# Altium footprint library 3M THD.PcbLib: 163 footprints (part 11 of 14) (continued)
## 3M_N3627-6202RB [mm] "3M, 3000 Series, 24 Contacts - Pitch 2.54mm - Straight Four-Wall Header (Black) With Short Roll Pin Latch/Ejectors" (continued)
Mechanical 14:
  circle w0.1: c-22.924,-0.254 r1.27
  circle w0.1: c22.924,-0.254 r1.27
  lines w0.1: -24.892,-3.175 -21.564,-3.175 ; -23.924,-0.254 -22.924,-0.254 ; -22.924,-1.254 -22.924,-0.254 ; -22.924,0.746 -22.924,-0.254 ; -21.924,-0.254 -22.924,-0.254 ; -21.564,-4.318 -21.564,-1.727 -14.605,-1.727 -14.605,1.27 -21.564,1.27 -21.564,4.318 ; -20.722,-4.318 -20.722,-1.727 ; -20.722,1.27 -20.722,4.318 ; -18.289,-4.318 -18.288,-1.727 ; -17.907,-1.727 -17.907,-3.175 17.907,-3.175 17.907,-1.727 ; -17.907,1.27 -17.907,3.175 17.907,3.175 17.907,1.27 ; -11.119,-4.318 -11.119,-3.175 ; -9.201,-4.318 -9.201,-3.175 ; 17.446,-4.318 17.446,-3.175 ; 17.446,3.175 17.446,4.318 ; 18.288,1.27 18.288,4.318 ; 18.329,-4.318 18.329,-1.727 ; 20.722,-4.318 20.722,-1.727 ; 20.722,1.27 20.722,4.318 ; 21.564,-4.318 21.564,-1.727 14.605,-1.727 14.605,1.27 21.564,1.27 21.564,4.318 ; 21.564,-3.175 24.892,-3.175 ; 21.564,3.175 24.892,3.175 ; 21.924,-0.254 22.924,-0.254 ; 22.924,-1.254 22.924,-0.254 ; 22.924,0.746 22.924,-0.254 ; 23.924,-0.254 22.924,-0.254 ; -24.892,-4.318 24.892,-4.318 24.892,4.318 -24.892,4.318 -24.892,-4.318 ; -24.892,3.175 -21.564,3.175 -24.892,3.175 ; -24.448,-1.134 -24.448,0.626 -22.924,1.506 -21.4,0.626 -21.4,-1.134 -22.924,-2.014 -24.448,-1.134 ; -18.288,1.27 -18.288,4.318 -18.288,1.27 ; -17.446,-4.318 -17.446,-3.175 -17.446,-4.318 ; -17.446,3.175 -17.446,4.318 -17.446,3.175 ; -15.24,-3.175 -13.97,-4.318 -12.7,-3.175 -15.24,-3.175 ; 21.4,-1.134 21.4,0.626 22.924,1.506 24.448,0.626 24.448,-1.134 22.924,-2.014 21.4,-1.134
  text "24" at 15.205,1.727 h1.02
  text "1" at -16.307,-2.921 h1.02
3D body "3M_N3627-6202RB.stp": height 18.69, standoff -2.84, extent -33.821,-4.318 33.821,4.318

## 3M_N3627-6202RB_a [mm] "3M, 3000 Series, 24 Contacts - Pitch 2.54mm - Straight Four-Wall Header (Black) With Short Roll Pin Latch/Ejectors"
height 24.6
pads (26):
  round 1.6 hole 0.9: 1(-13.97,-1.27) 2(-13.97,1.27) 3(-11.43,-1.27) 4(-11.43,1.27) 5(-8.89,-1.27) 6(-8.89,1.27) 7(-6.35,-1.27) 8(-6.35,1.27) 9(-3.81,-1.27) 10(-3.81,1.27) 11(-1.27,-1.27) 12(-1.27,1.27) 13(1.27,-1.27) 14(1.27,1.27) 15(3.81,-1.27) 16(3.81,1.27) 17(6.35,-1.27) 18(6.35,1.27) 19(8.89,-1.27) 20(8.89,1.27) 21(11.43,-1.27) 22(11.43,1.27) 23(13.97,-1.27) 24(13.97,1.27)
  round 4.6 hole 2.8: MTG1(-22.924,-0.254) MTG2(22.924,-0.254)
Top Overlay:
  lines w0.2: -24.892,-2 -24.892,-4.318 ; -24.892,1.7 -24.892,4.3 ; -2.032,-4.318 -2.032,-3.175 ; 2.032,-4.318 2.032,-3.175 ; 14.732,-4.318 -24.892,-4.318 ; 14.732,4.318 -24.892,4.318 24.892,4.318 ; 24.892,-2 24.892,-4.318 -24.892,-4.318 ; 24.892,1.7 24.892,4.3 ; -17.907,-3.175 17.907,-3.175 17.907,3.175 -17.907,3.175 -17.907,-3.175 ; -15.24,-3.175 -12.7,-3.175 -13.97,-4.318 -15.24,-3.175
  text "1" at -16.307,-2.921 h1.02
  text "24" at 15.205,1.727 h1.02
Mechanical 8:
  lines w0.1: -14.97,-1.27 -13.97,-1.27 ; -14.97,1.27 -13.97,1.27 ; -13.97,-2.27 -13.97,-1.27 ; -13.97,-0.27 -13.97,-1.27 ; -13.97,0.27 -13.97,1.27 ; -13.97,2.27 -13.97,1.27 ; -12.97,-1.27 -13.97,-1.27 ; -12.97,1.27 -13.97,1.27 ; -12.43,-1.27 -11.43,-1.27 ; -12.43,1.27 -11.43,1.27 ; -11.43,-2.27 -11.43,-1.27 ; -11.43,-0.27 -11.43,-1.27 ; -11.43,0.27 -11.43,1.27 ; -11.43,2.27 -11.43,1.27 ; -10.43,-1.27 -11.43,-1.27 ; -10.43,1.27 -11.43,1.27 ; -9.89,-1.27 -8.89,-1.27 ; -9.89,1.27 -8.89,1.27 ; -8.89,-2.27 -8.89,-1.27 ; -8.89,-0.27 -8.89,-1.27 ; -8.89,0.27 -8.89,1.27 ; -8.89,2.27 -8.89,1.27 ; -7.89,-1.27 -8.89,-1.27 ; -7.89,1.27 -8.89,1.27 ; -7.35,-1.27 -6.35,-1.27 ; -7.35,1.27 -6.35,1.27 ; -6.35,-2.27 -6.35,-1.27 ; -6.35,-0.27 -6.35,-1.27 ; -6.35,0.27 -6.35,1.27 ; -6.35,2.27 -6.35,1.27 ; -5.35,-1.27 -6.35,-1.27 ; -5.35,1.27 -6.35,1.27 ; -4.81,-1.27 -3.81,-1.27 ; -4.81,1.27 -3.81,1.27 ; -3.81,-2.27 -3.81,-1.27 ; -3.81,-0.27 -3.81,-1.27 ; -3.81,0.27 -3.81,1.27 ; -3.81,2.27 -3.81,1.27 ; -2.81,-1.27 -3.81,-1.27 ; -2.81,1.27 -3.81,1.27 ; -2.27,-1.27 -1.27,-1.27 ; -2.27,1.27 -1.27,1.27 ; -1.27,-2.27 -1.27,-1.27 ; -1.27,-0.27 -1.27,-1.27 ; -1.27,0.27 -1.27,1.27 ; -1.27,2.27 -1.27,1.27 ; -1,0 0,0 ; -0.27,-1.27 -1.27,-1.27 ; -0.27,1.27 -1.27,1.27 ; 0,-1 0,0 ; 0,1 0,0 ; 0.27,-1.27 1.27,-1.27 ; 0.27,1.27 1.27,1.27 ; 1,0 0,0 ; 1.27,-2.27 1.27,-1.27 ; 1.27,-0.27 1.27,-1.27 ; 1.27,0.27 1.27,1.27 ; 1.27,2.27 1.27,1.27 ; 2.27,-1.27 1.27,-1.27 ; 2.27,1.27 1.27,1.27 ; 2.81,-1.27 3.81,-1.27 ; 2.81,1.27 3.81,1.27 ; 3.81,-2.27 3.81,-1.27 ; 3.81,-0.27 3.81,-1.27 ; 3.81,0.27 3.81,1.27 ; 3.81,2.27 3.81,1.27 ; 4.81,-1.27 3.81,-1.27 ; 4.81,1.27 3.81,1.27 ; 5.35,-1.27 6.35,-1.27 ; 5.35,1.27 6.35,1.27 ; 6.35,-2.27 6.35,-1.27 ; 6.35,-0.27 6.35,-1.27 ; 6.35,0.27 6.35,1.27 ; 6.35,2.27 6.35,1.27 ; 7.35,-1.27 6.35,-1.27 ; 7.35,1.27 6.35,1.27 ; 7.89,-1.27 8.89,-1.27 ; 7.89,1.265 8.89,1.265 ; 8.89,-2.27 8.89,-1.27 ; 8.89,-0.27 8.89,-1.27 ; 8.89,0.27 8.89,1.27 ; 8.89,2.27 8.89,1.27 ; 9.89,-1.27 8.89,-1.27 ; 9.89,1.27 8.89,1.27 ; 10.43,-1.27 11.43,-1.27 ; 10.43,1.27 11.43,1.27 ; 11.43,-2.27 11.43,-1.27 ; 11.43,-0.27 11.43,-1.27 ; 11.43,0.27 11.43,1.27 ; 11.43,2.27 11.43,1.27 ; 12.43,-1.27 11.43,-1.27 ; 12.43,1.27 11.43,1.27 ; 12.97,-1.27 13.97,-1.27 ; 12.97,1.265 13.97,1.265 ; 13.97,-2.27 13.97,-1.27 ; 13.97,-0.27 13.97,-1.27 ; 13.97,0.27 13.97,1.27 ; 13.97,2.27 13.97,1.27 ; 14.97,-1.27 13.97,-1.27 ; 14.97,1.27 13.97,1.27
Mechanical 14:
  circle w0.1: c22.924,-0.254 r1.27
  circle w0.1: c-22.924,-0.254 r1.27
  lines w0.1: -24.892,-3.175 -21.564,-3.175 ; -23.924,-0.254 -22.924,-0.254 ; -22.924,-1.254 -22.924,-0.254 ; -22.924,0.746 -22.924,-0.254 ; -21.924,-0.254 -22.924,-0.254 ; -21.564,-4.318 -21.564,-1.727 -14.605,-1.727 -14.605,1.27 -21.564,1.27 -21.564,4.318 ; -20.722,-4.318 -20.722,-1.727 ; -20.722,1.27 -20.722,4.318 ; -18.289,-4.318 -18.288,-1.727 ; -17.907,-1.727 -17.907,-3.175 17.907,-3.175 17.907,-1.727 ; -17.907,1.27 -17.907,3.175 17.907,3.175 17.907,1.27 ; -11.119,-4.318 -11.119,-3.175 ; -9.201,-4.318 -9.201,-3.175 ; 17.446,-4.318 17.446,-3.175 ; 17.446,3.175 17.446,4.318 ; 18.288,1.27 18.288,4.318 ; 18.329,-4.318 18.329,-1.727 ; 20.722,-4.318 20.722,-1.727 ; 20.722,1.27 20.722,4.318 ; 21.564,-4.318 21.564,-1.727 14.605,-1.727 14.605,1.27 21.564,1.27 21.564,4.318 ; 21.564,-3.175 24.892,-3.175 ; 21.564,3.175 24.892,3.175 ; 21.924,-0.254 22.924,-0.254 ; 22.924,-1.254 22.924,-0.254 ; 22.924,0.746 22.924,-0.254 ; 23.924,-0.254 22.924,-0.254 ; -24.892,-4.318 -24.892,4.318 24.892,4.318 24.892,-4.318 -24.892,-4.318 ; -24.892,3.175 -21.564,3.175 -24.892,3.175 ; -24.448,-1.134 -22.924,-2.014 -21.4,-1.134 -21.4,0.626 -22.924,1.506 -24.448,0.626 -24.448,-1.134 ; -18.288,1.27 -18.288,4.318 -18.288,1.27 ; -17.446,-4.318 -17.446,-3.175 -17.446,-4.318 ; -17.446,3.175 -17.446,4.318 -17.446,3.175 ; -15.24,-3.175 -12.7,-3.175 -13.97,-4.318 -15.24,-3.175 ; 21.4,-1.134 22.924,-2.014 24.448,-1.134 24.448,0.626 22.924,1.506 21.4,0.626 21.4,-1.134
  text "1" at -16.307,-2.921 h1.02
  text "24" at 15.205,1.727 h1.02
3D body "3M_N3627-6202RB_a.stp": height 24.64, standoff -2.84, extent -24.892,-4.318 24.892,4.318

## 3M_N3764-5202RB [mm] "3M, 3000 Series, 64 Contacts - Pitch 2.54mm - Right Angle Four-Wall Header (Black) With Short Roll Pin Latch/Ejectors"
height 8.6
pads (66):
  round 1.6 hole 0.9: 1(-39.37,-1.27) 2(-39.37,1.27) 3(-36.83,-1.27) 4(-36.83,1.27) 5(-34.29,-1.27) 6(-34.29,1.27) 7(-31.75,-1.27) 8(-31.75,1.27) 9(-29.21,-1.27) 10(-29.21,1.27) 11(-26.67,-1.27) 12(-26.67,1.27) 13(-24.13,-1.27) 14(-24.13,1.27) 15(-21.59,-1.27) 16(-21.59,1.27) 17(-19.05,-1.27) 18(-19.05,1.27) 19(-16.51,-1.27) 20(-16.51,1.27) 21(-13.97,-1.27) 22(-13.97,1.27) 23(-11.43,-1.27) 24(-11.43,1.27) 25(-8.89,-1.27) 26(-8.89,1.27) 27(-6.35,-1.27) 28(-6.35,1.27) 29(-3.81,-1.27) 30(-3.81,1.27) 31(-1.27,-1.27) 32(-1.27,1.27) 33(1.27,-1.27) 34(1.27,1.27) 35(3.81,-1.27) 36(3.81,1.27) 37(6.35,-1.27) 38(6.35,1.27) 39(8.89,-1.27) 40(8.89,1.27) 41(11.43,-1.27) 42(11.43,1.27) 43(13.97,-1.27) 44(13.97,1.27) 45(16.51,-1.27) 46(16.51,1.27) 47(19.05,-1.27) 48(19.05,1.27) 49(21.59,-1.27) 50(21.59,1.27) 51(24.13,-1.27) 52(24.13,1.27) 53(26.67,-1.27) 54(26.67,1.27) 55(29.21,-1.27) 56(29.21,1.27) 57(31.75,-1.27) 58(31.75,1.27) 59(34.29,-1.27) 60(34.29,1.27) 61(36.83,-1.27) 62(36.83,1.27) 63(39.37,-1.27) 64(39.37,1.27)
  round 4.6 hole 2.8: MTG1(-45.275,0.53) MTG2(45.275,0.53)
Top Overlay:
  circle w0.2: c44.971,6.375 r0.953
  circle w0.2: c-44.945,6.375 r0.953
  circle w0.2: c-39.443,-3.048 r0.15
  lines w0.2: -53.684,9.877 -51.106,14.342 ccw(c-51.194,14.393) -51.143,14.481 -54.058,16.163 -59.163,13.216 ccw(c-59.112,13.128) -59.163,13.04 -52.174,9.005 -49.863,6.25 ; -52.071,12.67 -48.315,10.502 ; -50.342,-2.007 -47.185,-2.007 -47.803,-2.007 cw(c-48.311,-2.007) -48.819,-2.007 -50.279,-2.007 -50.279,5.105 -46.951,14.249 -46.109,14.249 ccw(c-44.945,14.757) -43.675,14.757 -42.833,14.757 -42.391,12.251 ccw(c-41.141,12.471) -41.141,11.201 41.166,11.201 ccw(c41.166,12.471) 42.417,12.251 42.859,14.757 43.701,14.757 ccw(c44.971,14.757) 46.135,14.249 46.977,14.249 50.305,5.105 50.305,-2.007 48.844,-2.007 cw(c48.336,-2.007) 47.828,-2.007 47.185,-2.007 50.368,-2.007 ; -40.545,11.201 -39.275,9.002 -38.738,9.931 ; -39.046,11.201 -39.046,9.931 -37.128,9.931 -37.128,11.201 ; -2.019,5.105 2.045,5.105 ; -2.019,11.201 -2.019,3.581 2.045,3.581 2.045,11.201 ; -1.587,5.105 -1.587,11.201 -0.952,11.201 -0.952,5.105 ; 0.953,5.105 0.953,11.201 1.588,11.201 1.588,5.105 ; 48.341,10.502 52.097,12.67 ; 49.888,6.25 52.2,9.005 59.189,13.04 ccw(c59.138,13.128) 59.189,13.216 54.083,16.163 51.169,14.481 ccw(c51.22,14.393) 51.132,14.342 53.71,9.877
  text "64" at 38.53,2.739 h1.2
  text "1" at -41.402,-1.7 h1.2
Mechanical 8:
  drawing of 268 lines, arcs and shapes, not listed
Mechanical 14:
  circle w0.1: c44.971,6.375 r0.953
  circle w0.1: c-44.945,6.375 r0.953
  circle w0.1: c45.288,0.533 r1.27
  circle w0.1: c-45.263,0.533 r1.27
  lines w0.1: -53.684,9.877 -51.106,14.342 ccw(c-51.194,14.393) -51.143,14.481 -54.058,16.163 -59.163,13.216 ccw(c-59.112,13.128) -59.163,13.04 -52.174,9.005 -49.863,6.25 ; -52.071,12.67 -48.315,10.502 ; -50.342,-2.007 50.368,-2.007 ; -47.765,-2.007 -47.765,1.978 -45.263,3.422 -42.761,1.978 -42.761,-2.007 ; -40.545,11.201 -39.275,9.002 -38.738,9.931 ; -39.046,11.201 -39.046,9.931 -37.128,9.931 -37.128,11.201 ; -2.019,5.105 2.045,5.105 ; -2.019,11.201 -2.019,3.581 2.045,3.581 2.045,11.201 ; -1.587,5.105 -1.587,11.201 -0.952,11.201 -0.952,5.105 ; 0.953,5.105 0.953,11.201 1.588,11.201 1.588,5.105 ; 42.786,-2.007 42.786,1.978 45.288,3.422 47.79,1.978 47.79,-2.007 ; 48.341,10.502 52.097,12.67 ; 49.888,6.25 52.2,9.005 59.189,13.04 ccw(c59.138,13.128) 59.189,13.216 54.083,16.163 51.169,14.481 ccw(c51.22,14.393) 51.132,14.342 53.71,9.877 ; -50.279,-2.007 -48.819,-2.007 ccw(c-48.311,-2.007) -47.803,-2.007 -6.845,-2.007 ccw(c-6.337,-2.007) -5.829,-2.007 5.855,-2.007 ccw(c6.363,-2.007) 6.871,-2.007 47.828,-2.007 ccw(c48.336,-2.007) 48.844,-2.007 50.305,-2.007 50.305,5.105 46.977,14.249 46.135,14.249 cw(c44.971,14.757) 43.701,14.757 42.859,14.757 42.417,12.251 cw(c41.166,12.471) 41.166,11.201 -41.141,11.201 cw(c-41.141,12.471) -42.391,12.251 -42.833,14.757 -43.675,14.757 cw(c-44.945,14.757) -46.109,14.249 -46.951,14.249 -50.279,5.105 -50.279,-2.007
  text "64" at 38.53,2.739 h1.2
  text "1" at -41.402,-1.7 h1.2
3D body "3M_N3764-5202RB.stp": height 8.64, standoff -2.84, extent -59.208,-2.514 59.234,16.179

## 3M_N3764-5202RB_a [mm] "3M, 3000 Series, 64 Contacts - Pitch 2.54mm - Right Angle Four-Wall Header (Black) With Short Roll Pin Latch/Ejectors"
height 8.6
pads (66):
  round 1.6 hole 0.9: 1(-39.37,-1.27) 2(-39.37,1.27) 3(-36.83,-1.27) 4(-36.83,1.27) 5(-34.29,-1.27) 6(-34.29,1.27) 7(-31.75,-1.27) 8(-31.75,1.27) 9(-29.21,-1.27) 10(-29.21,1.27) 11(-26.67,-1.27) 12(-26.67,1.27) 13(-24.13,-1.27) 14(-24.13,1.27) 15(-21.59,-1.27) 16(-21.59,1.27) 17(-19.05,-1.27) 18(-19.05,1.27) 19(-16.51,-1.27) 20(-16.51,1.27) 21(-13.97,-1.27) 22(-13.97,1.27) 23(-11.43,-1.27) 24(-11.43,1.27) 25(-8.89,-1.27) 26(-8.89,1.27) 27(-6.35,-1.27) 28(-6.35,1.27) 29(-3.81,-1.27) 30(-3.81,1.27) 31(-1.27,-1.27) 32(-1.27,1.27) 33(1.27,-1.27) 34(1.27,1.27) 35(3.81,-1.27) 36(3.81,1.27) 37(6.35,-1.27) 38(6.35,1.27) 39(8.89,-1.27) 40(8.89,1.27) 41(11.43,-1.27) 42(11.43,1.27) 43(13.97,-1.27) 44(13.97,1.27) 45(16.51,-1.27) 46(16.51,1.27) 47(19.05,-1.27) 48(19.05,1.27) 49(21.59,-1.27) 50(21.59,1.27) 51(24.13,-1.27) 52(24.13,1.27) 53(26.67,-1.27) 54(26.67,1.27) 55(29.21,-1.27) 56(29.21,1.27) 57(31.75,-1.27) 58(31.75,1.27) 59(34.29,-1.27) 60(34.29,1.27) 61(36.83,-1.27) 62(36.83,1.27) 63(39.37,-1.27) 64(39.37,1.27)
  round 4.6 hole 2.8: MTG1(-45.275,0.53) MTG2(45.275,0.53)
Top Overlay:
  circle w0.2: c44.971,6.375 r0.953
  circle w0.2: c-44.945,6.375 r0.953
  circle w0.2: c-39.443,-3.048 r0.15
  lines w0.2: -50.342,-2.007 -47.185,-2.007 -47.803,-2.007 cw(c-48.311,-2.007) -48.819,-2.007 -50.279,-2.007 -50.279,5.105 -46.951,14.249 -46.109,14.249 ccw(c-44.945,14.757) -43.675,14.757 -42.833,14.757 -42.391,12.251 ccw(c-41.141,12.471) -41.141,11.201 41.166,11.201 ccw(c41.166,12.471) 42.417,12.251 42.859,14.757 43.701,14.757 ccw(c44.971,14.757) 46.135,14.249 46.977,14.249 50.305,5.105 50.305,-2.007 48.844,-2.007 cw(c48.336,-2.007) 47.828,-2.007 47.185,-2.007 50.368,-2.007 ; -40.545,11.201 -39.275,9.002 -38.738,9.931 ; -39.046,11.201 -39.046,9.931 -37.128,9.931 -37.128,11.201 ; -2.019,5.105 2.045,5.105 ; -2.019,11.201 -2.019,3.581 2.045,3.581 2.045,11.201 ; -1.587,5.105 -1.587,11.201 -0.952,11.201 -0.952,5.105 ; 0.953,5.105 0.953,11.201 1.588,11.201 1.588,5.105 ; 43.066,14.757 43.066,20.337 ; 46.292,14.249 46.292,22.024 ccw(c46.19,22.024) 46.139,22.112 41.034,19.164 41.034,15.799 ccw(c41.135,15.799) 41.135,15.697 46.292,15.697 ; -46.266,22.024 cw(c-46.164,22.024) -46.114,22.112 ; -46.266,22.024 cw(c-46.164,22.024) -46.114,22.112 ; -46.266,22.024 -46.266,14.249 -46.266,22.024 ; -46.114,22.112 -41.008,19.164 ; -46.114,22.112 -41.008,19.164 ; -41.11,15.697 ccw(c-41.11,15.799) -41.008,15.799 ; -41.11,15.697 ccw(c-41.11,15.799) -41.008,15.799 ; -41.11,15.697 -46.266,15.697 -41.11,15.697 ; -41.008,15.799 -41.008,19.164 ; -41.008,15.799 -41.008,19.164 ; -43.064,14.757 -43.048,20.341 -43.064,14.757
  text "64" at 38.53,2.739 h1.2
  text "1" at -41.402,-1.7 h1.2
Mechanical 8:
  drawing of 268 lines, arcs and shapes, not listed
Mechanical 14:
  circle w0.1: c44.971,6.375 r0.953
  circle w0.1: c-44.945,6.375 r0.953
  circle w0.1: c45.288,0.533 r1.27
  circle w0.1: c-45.263,0.533 r1.27
  lines w0.1: -50.342,-2.007 50.368,-2.007 ; -47.765,-2.007 -47.765,1.978 -45.263,3.422 -42.761,1.978 -42.761,-2.007 ; -40.545,11.201 -39.275,9.002 -38.738,9.931 ; -39.046,11.201 -39.046,9.931 -37.128,9.931 -37.128,11.201 ; -2.019,5.105 2.045,5.105 ; -2.019,11.201 -2.019,3.581 2.045,3.581 2.045,11.201 ; -1.587,5.105 -1.587,11.201 -0.952,11.201 -0.952,5.105 ; 0.953,5.105 0.953,11.201 1.588,11.201 1.588,5.105 ; 42.786,-2.007 42.786,1.978 45.288,3.422 47.79,1.978 47.79,-2.007 ; 43.066,14.757 43.066,20.337 ; 46.292,14.249 46.292,22.024 ccw(c46.19,22.024) 46.139,22.112 41.034,19.164 41.034,15.799 ccw(c41.135,15.799) 41.135,15.697 46.292,15.697 ; -46.266,22.024 cw(c-46.164,22.024) -46.114,22.112 ; -46.266,22.024 cw(c-46.164,22.024) -46.114,22.112 ; -46.266,22.024 -46.266,14.249 -46.266,22.024 ; -46.114,22.112 -41.008,19.164 ; -46.114,22.112 -41.008,19.164 ; -41.11,15.697 ccw(c-41.11,15.799) -41.008,15.799 ; -41.11,15.697 ccw(c-41.11,15.799) -41.008,15.799 ; -41.11,15.697 -46.266,15.697 -41.11,15.697 ; -41.008,15.799 -41.008,19.164 ; -41.008,15.799 -41.008,19.164 ; -50.279,-2.007 -48.819,-2.007 ccw(c-48.311,-2.007) -47.803,-2.007 -6.845,-2.007 ccw(c-6.337,-2.007) -5.829,-2.007 5.855,-2.007 ccw(c6.363,-2.007) 6.871,-2.007 47.828,-2.007 ccw(c48.336,-2.007) 48.844,-2.007 50.305,-2.007 50.305,5.105 46.977,14.249 46.135,14.249 cw(c44.971,14.757) 43.701,14.757 42.859,14.757 42.417,12.251 cw(c41.166,12.471) 41.166,11.201 -41.141,11.201 cw(c-41.141,12.471) -42.391,12.251 -42.833,14.757 -43.675,14.757 cw(c-44.945,14.757) -46.109,14.249 -46.951,14.249 -50.279,5.105 -50.279,-2.007 ; -43.064,14.757 -43.048,20.341 -43.064,14.757
  text "64" at 38.53,2.739 h1.2
  text "1" at -41.402,-1.7 h1.2
3D body "3M_N3764-5202RB_a.stp": height 8.64, standoff -2.84, extent -50.279,-2.514 50.305,22.125

## 3M_N3764-5302RB [mm] "3M, 3000 Series, 64 Contacts - Pitch 2.54mm - Right Angle Four-Wall Header (Black) With Long Roll Pin Latch/Ejectors"
height 8.6
pads (66):
  round 1.6 hole 0.9: 1(-39.37,-1.27) 2(-39.37,1.27) 3(-36.83,-1.27) 4(-36.83,1.27) 5(-34.29,-1.27) 6(-34.29,1.27) 7(-31.75,-1.27) 8(-31.75,1.27) 9(-29.21,-1.27) 10(-29.21,1.27) 11(-26.67,-1.27) 12(-26.67,1.27) 13(-24.13,-1.27) 14(-24.13,1.27) 15(-21.59,-1.27) 16(-21.59,1.27) 17(-19.05,-1.27) 18(-19.05,1.27) 19(-16.51,-1.27) 20(-16.51,1.27) 21(-13.97,-1.27) 22(-13.97,1.27) 23(-11.43,-1.27) 24(-11.43,1.27) 25(-8.89,-1.27) 26(-8.89,1.27) 27(-6.35,-1.27) 28(-6.35,1.27) 29(-3.81,-1.27) 30(-3.81,1.27) 31(-1.27,-1.27) 32(-1.27,1.27) 33(1.27,-1.27) 34(1.27,1.27) 35(3.81,-1.27) 36(3.81,1.27) 37(6.35,-1.27) 38(6.35,1.27) 39(8.89,-1.27) 40(8.89,1.27) 41(11.43,-1.27) 42(11.43,1.27) 43(13.97,-1.27) 44(13.97,1.27) 45(16.51,-1.27) 46(16.51,1.27) 47(19.05,-1.27) 48(19.05,1.27) 49(21.59,-1.27) 50(21.59,1.27) 51(24.13,-1.27) 52(24.13,1.27) 53(26.67,-1.27) 54(26.67,1.27) 55(29.21,-1.27) 56(29.21,1.27) 57(31.75,-1.27) 58(31.75,1.27) 59(34.29,-1.27) 60(34.29,1.27) 61(36.83,-1.27) 62(36.83,1.27) 63(39.37,-1.27) 64(39.37,1.27)
  round 4.6 hole 2.8: MTG1(-45.275,0.53) MTG2(45.275,0.53)
Top Overlay:
  circle w0.2: c-39.443,-3.048 r0.15
  circle w0.2: c-44.945,6.375 r0.953
  circle w0.2: c44.971,6.375 r0.953
  lines w0.2: -55.882,11.145 -53.304,15.611 ccw(c-53.392,15.662) -53.341,15.75 -56.255,17.432 -61.361,14.485 ccw(c-61.31,14.397) -61.361,14.309 -52.174,9.005 -49.863,6.25 ; -54.269,13.939 -48.315,10.502 ; -50.342,-2.007 -47.185,-2.007 -47.803,-2.007 cw(c-48.311,-2.007) -48.819,-2.007 -50.279,-2.007 -50.279,5.105 -46.951,14.249 -46.109,14.249 ccw(c-44.945,14.757) -43.675,14.757 -42.833,14.757 -42.391,12.251 ccw(c-41.141,12.471) -41.141,11.201 41.166,11.201 ccw(c41.166,12.471) 42.417,12.251 42.859,14.757 43.701,14.757 ccw(c44.971,14.757) 46.135,14.249 46.977,14.249 50.305,5.105 50.305,-2.007 48.844,-2.007 cw(c48.336,-2.007) 47.828,-2.007 47.185,-2.007 50.368,-2.007 ; -40.545,11.201 -39.275,9.002 -38.738,9.931 ; -39.046,11.201 -39.046,9.931 -37.128,9.931 -37.128,11.201 ; -2.019,5.105 2.045,5.105 ; -2.019,11.201 -2.019,3.581 2.045,3.581 2.045,11.201 ; -1.587,5.105 -1.587,11.201 -0.952,11.201 -0.952,5.105 ; 0.953,5.105 0.953,11.201 1.588,11.201 1.588,5.105 ; 48.341,10.502 54.295,13.939 ; 49.888,6.25 52.2,9.005 61.386,14.309 ccw(c61.335,14.397) 61.386,14.485 56.281,17.432 53.367,15.75 ccw(c53.417,15.662) 53.329,15.611 55.907,11.145
  text "1" at -41.402,-1.7 h1.2
  text "64" at 38.53,2.739 h1.2
Mechanical 8:
  drawing of 268 lines, arcs and shapes, not listed
Mechanical 14:
  circle w0.1: c-45.263,0.533 r1.27
  circle w0.1: c45.288,0.533 r1.27
  circle w0.1: c-44.945,6.375 r0.953
  circle w0.1: c44.971,6.375 r0.953
  lines w0.1: -55.882,11.145 -53.304,15.611 ccw(c-53.392,15.662) -53.341,15.75 -56.255,17.432 -61.361,14.485 ccw(c-61.31,14.397) -61.361,14.309 -52.174,9.005 -49.863,6.25 ; -54.269,13.939 -48.315,10.502 ; -50.342,-2.007 50.368,-2.007 ; -47.765,-2.007 -47.765,1.978 -45.263,3.422 -42.761,1.978 -42.761,-2.007 ; -40.545,11.201 -39.275,9.002 -38.738,9.931 ; -39.046,11.201 -39.046,9.931 -37.128,9.931 -37.128,11.201 ; -2.019,5.105 2.045,5.105 ; -2.019,11.201 -2.019,3.581 2.045,3.581 2.045,11.201 ; -1.587,5.105 -1.587,11.201 -0.952,11.201 -0.952,5.105 ; 0.953,5.105 0.953,11.201 1.588,11.201 1.588,5.105 ; 42.786,-2.007 42.786,1.978 45.288,3.422 47.79,1.978 47.79,-2.007 ; 48.341,10.502 54.295,13.939 ; 49.888,6.25 52.2,9.005 61.386,14.309 ccw(c61.335,14.397) 61.386,14.485 56.281,17.432 53.367,15.75 ccw(c53.417,15.662) 53.329,15.611 55.907,11.145 ; -50.279,-2.007 -50.279,5.105 -46.951,14.249 -46.109,14.249 ccw(c-44.945,14.757) -43.675,14.757 -42.833,14.757 -42.391,12.251 ccw(c-41.141,12.471) -41.141,11.201 41.166,11.201 ccw(c41.166,12.471) 42.417,12.251 42.859,14.757 43.701,14.757 ccw(c44.971,14.757) 46.135,14.249 46.977,14.249 50.305,5.105 50.305,-2.007 48.844,-2.007 cw(c48.336,-2.007) 47.828,-2.007 6.871,-2.007 cw(c6.363,-2.007) 5.855,-2.007 -5.829,-2.007 cw(c-6.337,-2.007) -6.845,-2.007 -47.803,-2.007 cw(c-48.311,-2.007) -48.819,-2.007 -50.279,-2.007
  text "1" at -41.402,-1.7 h1.2
  text "64" at 38.53,2.739 h1.2
3D body "3M_N3764-5302RB.stp": height 8.64, standoff -2.84, extent -61.406,-2.514 61.431,17.448

## 3M_N3764-5302RB_a [mm] "3M, 3000 Series, 64 Contacts - Pitch 2.54mm - Right Angle Four-Wall Header (Black) With Long Roll Pin Latch/Ejectors"
height 8.6
pads (66):
  round 1.6 hole 0.9: 1(-39.37,-1.27) 2(-39.37,1.27) 3(-36.83,-1.27) 4(-36.83,1.27) 5(-34.29,-1.27) 6(-34.29,1.27) 7(-31.75,-1.27) 8(-31.75,1.27) 9(-29.21,-1.27) 10(-29.21,1.27) 11(-26.67,-1.27) 12(-26.67,1.27) 13(-24.13,-1.27) 14(-24.13,1.27) 15(-21.59,-1.27) 16(-21.59,1.27) 17(-19.05,-1.27) 18(-19.05,1.27) 19(-16.51,-1.27) 20(-16.51,1.27) 21(-13.97,-1.27) 22(-13.97,1.27) 23(-11.43,-1.27) 24(-11.43,1.27) 25(-8.89,-1.27) 26(-8.89,1.27) 27(-6.35,-1.27) 28(-6.35,1.27) 29(-3.81,-1.27) 30(-3.81,1.27) 31(-1.27,-1.27) 32(-1.27,1.27) 33(1.27,-1.27) 34(1.27,1.27) 35(3.81,-1.27) 36(3.81,1.27) 37(6.35,-1.27) 38(6.35,1.27) 39(8.89,-1.27) 40(8.89,1.27) 41(11.43,-1.27) 42(11.43,1.27) 43(13.97,-1.27) 44(13.97,1.27) 45(16.51,-1.27) 46(16.51,1.27) 47(19.05,-1.27) 48(19.05,1.27) 49(21.59,-1.27) 50(21.59,1.27) 51(24.13,-1.27) 52(24.13,1.27) 53(26.67,-1.27) 54(26.67,1.27) 55(29.21,-1.27) 56(29.21,1.27) 57(31.75,-1.27) 58(31.75,1.27) 59(34.29,-1.27) 60(34.29,1.27) 61(36.83,-1.27) 62(36.83,1.27) 63(39.37,-1.27) 64(39.37,1.27)
  round 4.6 hole 2.8: MTG1(-45.275,0.53) MTG2(45.275,0.53)
Top Overlay:
  circle w0.2: c44.971,6.375 r0.953
  circle w0.2: c-44.945,6.375 r0.953
  circle w0.2: c-39.443,-3.048 r0.15
  lines w0.2: -50.342,-2.007 -47.185,-2.007 -47.803,-2.007 cw(c-48.311,-2.007) -48.819,-2.007 -50.279,-2.007 -50.279,5.105 -46.951,14.249 -46.109,14.249 ccw(c-44.945,14.757) -43.675,14.757 -42.833,14.757 -42.391,12.251 ccw(c-41.141,12.471) -41.141,11.201 41.166,11.201 ccw(c41.166,12.471) 42.417,12.251 42.859,14.757 43.701,14.757 ccw(c44.971,14.757) 46.135,14.249 46.977,14.249 50.305,5.105 50.305,-2.007 48.844,-2.007 cw(c48.336,-2.007) 47.828,-2.007 47.185,-2.007 50.368,-2.007 ; -46.266,14.249 -46.266,24.561 cw(c-46.164,24.561) -46.114,24.649 -41.008,21.702 -41.008,18.336 cw(c-41.11,18.336) -41.11,18.235 -46.266,18.235 ; -43.064,14.757 -43.04,22.875 ; -40.545,11.201 -39.275,9.002 -38.738,9.931 ; -39.046,11.201 -39.046,9.931 -37.128,9.931 -37.128,11.201 ; -2.019,5.105 2.045,5.105 ; -2.019,11.201 -2.019,3.581 2.045,3.581 2.045,11.201 ; -1.587,5.105 -1.587,11.201 -0.952,11.201 -0.952,5.105 ; 0.953,5.105 0.953,11.201 1.588,11.201 1.588,5.105 ; 43.066,14.757 43.066,22.875 ; 46.292,14.249 46.292,24.561 ccw(c46.19,24.561) 46.139,24.649 41.034,21.702 41.034,18.336 ccw(c41.135,18.336) 41.135,18.235 46.292,18.235
  text "64" at 38.53,2.739 h1.2
  text "1" at -41.402,-1.7 h1.2
Mechanical 8:
  drawing of 268 lines, arcs and shapes, not listed
Mechanical 14:
  circle w0.1: c44.971,6.375 r0.953
  circle w0.1: c-44.945,6.375 r0.953
  circle w0.1: c45.288,0.533 r1.27
  circle w0.1: c-45.263,0.533 r1.27
  lines w0.1: -50.342,-2.007 50.368,-2.007 ; -47.765,-2.007 -47.765,1.978 -45.263,3.422 -42.761,1.978 -42.761,-2.007 ; -46.266,14.249 -46.266,24.561 cw(c-46.164,24.561) -46.114,24.649 -41.008,21.702 -41.008,18.336 cw(c-41.11,18.336) -41.11,18.235 -46.266,18.235 ; -43.064,14.757 -43.04,22.875 ; -40.545,11.201 -39.275,9.002 -38.738,9.931 ; -39.046,11.201 -39.046,9.931 -37.128,9.931 -37.128,11.201 ; -2.019,5.105 2.045,5.105 ; -2.019,11.201 -2.019,3.581 2.045,3.581 2.045,11.201 ; -1.587,5.105 -1.587,11.201 -0.952,11.201 -0.952,5.105 ; 0.953,5.105 0.953,11.201 1.588,11.201 1.588,5.105 ; 42.786,-2.007 42.786,1.978 45.288,3.422 47.79,1.978 47.79,-2.007 ; 43.066,14.757 43.066,22.875 ; 46.292,14.249 46.292,24.561 ccw(c46.19,24.561) 46.139,24.649 41.034,21.702 41.034,18.336 ccw(c41.135,18.336) 41.135,18.235 46.292,18.235 ; -50.279,-2.007 -48.819,-2.007 ccw(c-48.311,-2.007) -47.803,-2.007 -6.845,-2.007 ccw(c-6.337,-2.007) -5.829,-2.007 5.855,-2.007 ccw(c6.363,-2.007) 6.871,-2.007 47.828,-2.007 ccw(c48.336,-2.007) 48.844,-2.007 50.305,-2.007 50.305,5.105 46.977,14.249 46.135,14.249 cw(c44.971,14.757) 43.701,14.757 42.859,14.757 42.417,12.251 cw(c41.166,12.471) 41.166,11.201 -41.141,11.201 cw(c-41.141,12.471) -42.391,12.251 -42.833,14.757 -43.675,14.757 cw(c-44.945,14.757) -46.109,14.249 -46.951,14.249 -50.279,5.105 -50.279,-2.007
  text "64" at 38.53,2.739 h1.2
  text "1" at -41.402,-1.7 h1.2
3D body "3M_N3764-5302RB_a.stp": height 8.64, standoff -2.84, extent -50.279,-2.514 50.305,24.663